# Altium schematic symbol library AliPadash.SchLib: 1186 symbols (part 6 of 6)
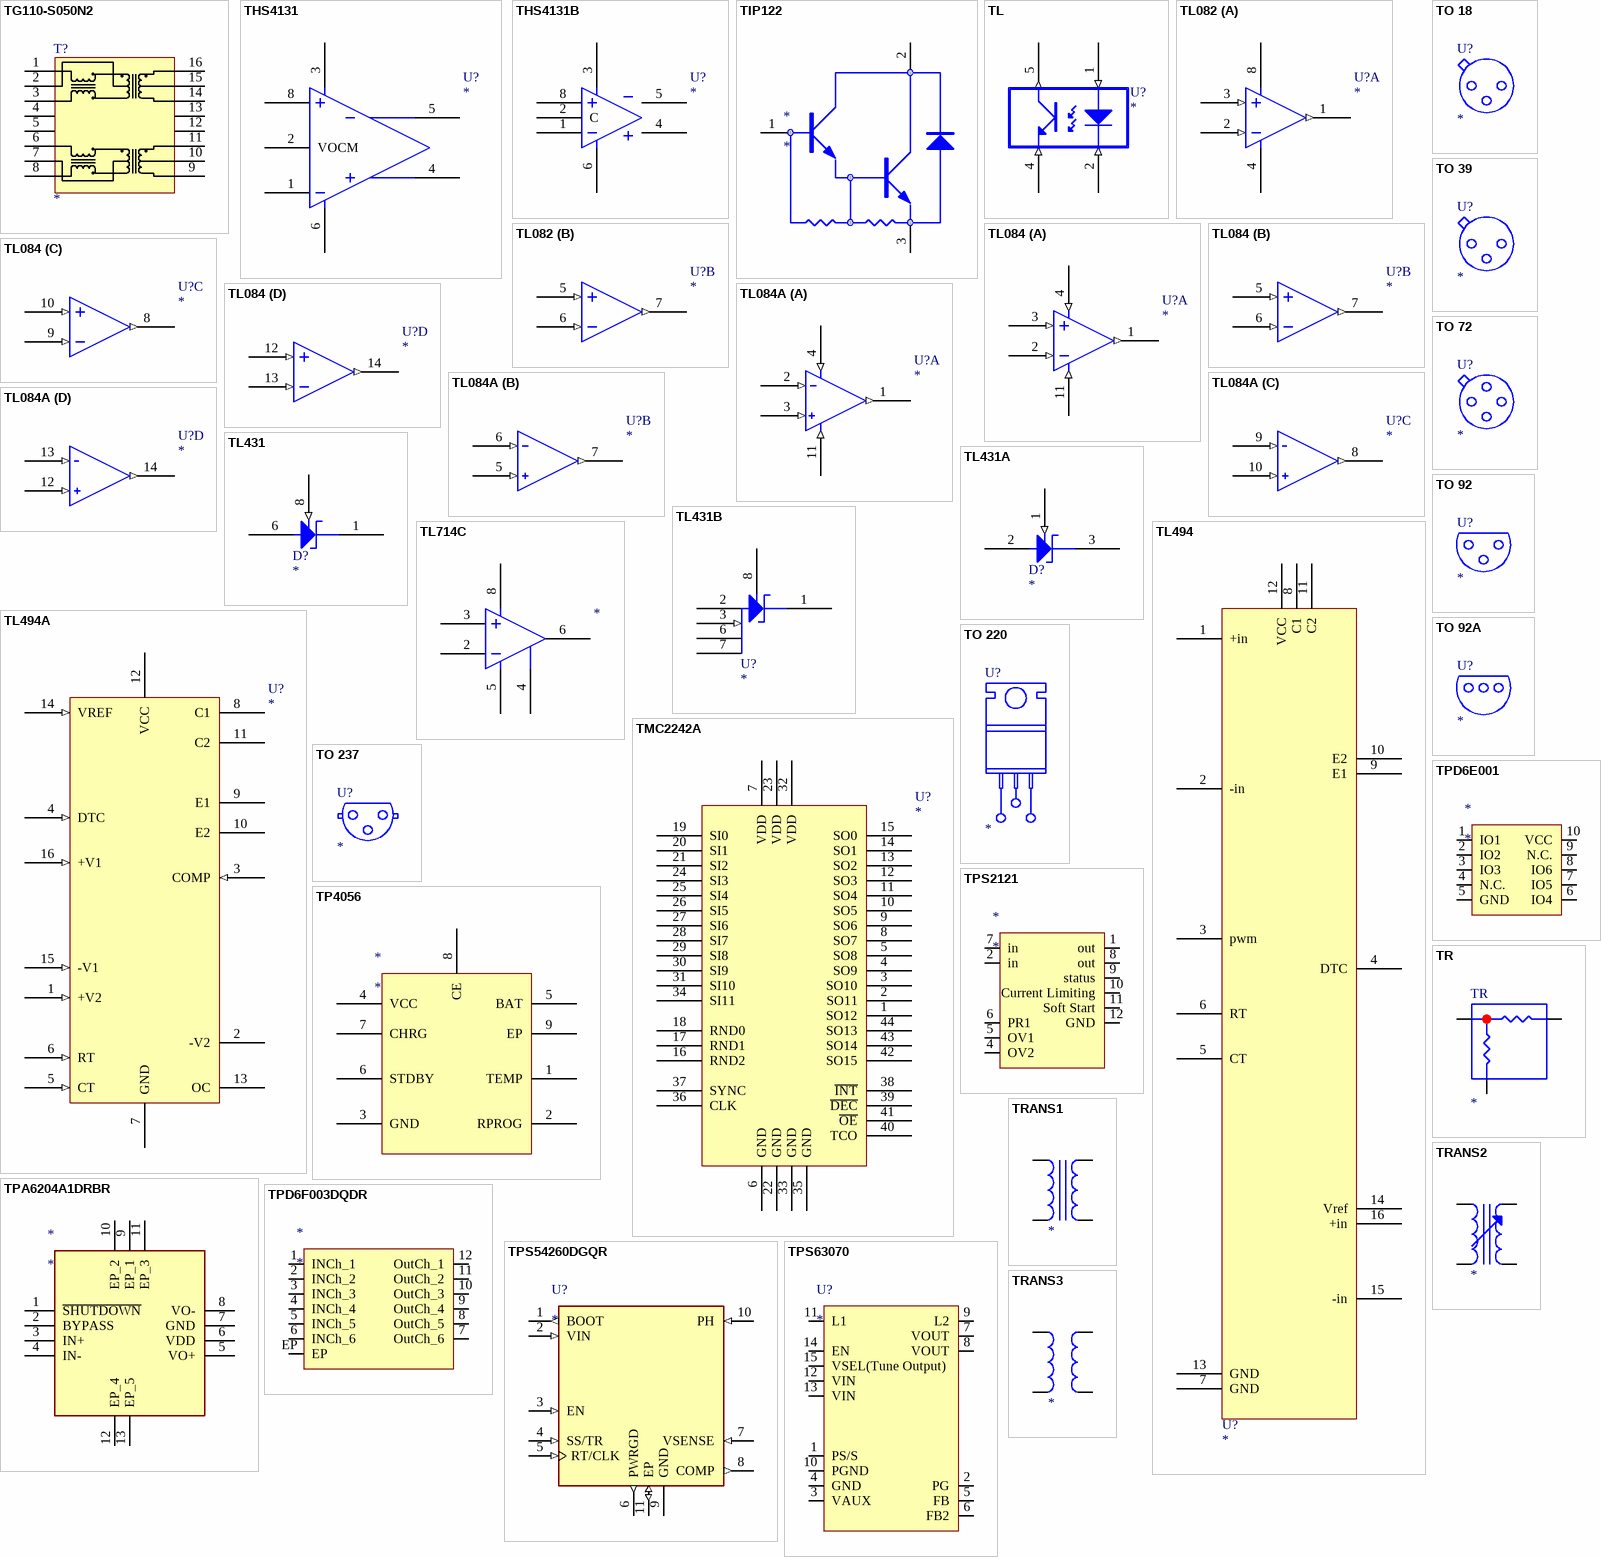
[diagram p91: symbols TG110-S050N2 to TRANS3]

## THS4131
designator U?
footprint SO-8
pins: 1, 2 VOCM, 3, 4, 5, 6, 8

## THS4131B
designator U?
footprint SO-8
pins: 1, 2 C, 3, 4, 5, 6, 8

## TIP122
designator *
pins: 1, 2, 3

## TL
designator U?
pins: 1 A (in), 2 C (in), 4 E (in), 5 CL (out)

## TL082
designator U?
part A pins: 1 OUT (out), 2 -IN (in), 3 +IN (in), 4 V-, 8 V+
part B pins: 5 +IN (in), 6 -IN (in), 7 OUT (out)

## TL084
designator U?
part A pins: 1 OUT (out), 2 IN- (in), 3 IN+ (in), 4 V+ (in), 11 V- (in)
part B pins: 5 IN+ (in), 6 IN- (in), 7 OUT (out)
part C pins: 8 OUT (out), 9 IN- (in), 10 IN+ (in)
part D pins: 12 IN+ (in), 13 IN- (in), 14 OUT (out)

## TL084A
designator U?
part A pins: 1 OUT (out), 2 IN- (in), 3 IN+ (in), 4 V+ (in), 11 V- (in)
part B pins: 5 IN+ (in), 6 IN- (in), 7 OUT (out)
part C pins: 8 OUT (out), 9 IN- (in), 10 IN+ (in)
part D pins: 12 IN+ (in), 13 IN- (in), 14 OUT (out)

## TL431
designator D?
pins: 1 C, 6 A, 8 VREF (in)

## TL431A
designator D?
footprint to-92
pins: 1 VREF (in), 2 A, 3 C

## TL431B
designator U?
footprint SO-8
pins: 1 C, 2 A, 3 VREF (in), 6, 7, 8

## TL494
designator U?
footprint DIP16
pins: 1 +in, 2 -in, 3 pwm, 4 DTC, 5 CT, 6 RT, 7 GND, 8 C1, 9 E1, 10 E2, 11 C2, 12 VCC, 13 GND, 14 Vref, 15 -in, 16 +in

## TL494A
designator U?
pins: 1 +V2 (in), 2 -V2, 3 COMP (in), 4 DTC (in), 5 CT (in), 6 RT (in), 7 GND, 8 C1, 9 E1, 10 E2, 11 C2, 12 VCC, 13 OC, 14 VREF (in), 15 -V1 (in), 16 +V1 (in)

## TL714C
designator ?
pins: 2, 3, 4, 5, 6, 8

## TMC2242A
designator U?
footprint LQFP44
pins: 1 SO12, 2 SO11, 3 SO10, 4 SO9, 5 SO8, 6 GND, 7 VDD, 8 SO7, 9 SO6, 10 SO5, 11 SO4, 12 SO3, 13 SO2, 14 SO1, 15 SO0, 16 RND2, 17 RND1, 18 RND0, 19 SI0, 20 SI1, 21 SI2, 22 GND, 23 VDD, 24 SI3, 25 SI4, 26 SI5, 27 SI6, 28 SI7, 29 SI8, 30 SI9, 31 SI10, 32 VDD, 33 GND, 34 SI11, 35 GND, 36 CLK, 37 SYNC, 38 ~{INT}, 39 ~{DEC}, 40 TCO, 41 ~{OE}, 42 SO15, 43 SO14, 44 SO13

## TO 18
designator U?

## TO 39
designator U?

## TO 72
designator U?

## TO 92
designator U?

## TO 92A
designator U?

## TO 220
designator U?

## TO 237
designator U?

## TP4056
designator *
footprint so-8-ep
pins: 1 TEMP, 2 RPROG, 3 GND, 4 VCC, 5 BAT, 6 STDBY, 7 CHRG, 8 CE, 9 EP

## TPA6204A1DRBR
designator *
MFAC: TPA6204A1DRBR; jlc: C12400
footprint TPA6204A1DRBR
pins: 1 ~{SHUTDOWN}, 2 BYPASS, 3 IN+, 4 IN-, 5 VO+, 6 VDD, 7 GND, 8 VO-, 9 EP_1, 10 EP_2, 11 EP_3, 12 EP_4, 13 EP_5

## TPD6E001
designator *
footprint UQFN10 (Footprint not found)
pins: 1 IO1, 2 IO2, 3 IO3, 4 N.C., 5 GND, 6 IO4, 7 IO5, 8 IO6, 9 N.C., 10 VCC

## TPD6F003DQDR
designator *
footprint DSV12 (Footprint not found)
pins: 1 INCh_1, 2 INCh_2, 3 INCh_3, 4 INCh_4, 5 INCh_5, 6 INCh_6, 7 OutCh_6, 8 OutCh_5, 9 OutCh_4, 10 OutCh_3, 11 OutCh_2, 12 OutCh_1, EP

## TPS2121
designator *
pins: 1 out, 2 in, 4 OV2, 5 OV1, 6 PR1, 7 in, 8 out, 9 status, 10 Current Limiting, 11 Soft Start, 12 GND

## TPS54260DGQR
designator U?
MFAC: TPS54260DGQR; JLC: C51800
footprint S_XTR111AIDGQR
pins: 1 BOOT (out), 2 VIN (in), 3 EN (in), 4 SS/TR (in), 5 RT/CLK (in), 6 PWRGD (out), 7 VSENSE (in), 8 COMP (out), 9 GND (power), 10 PH (in), 11 EP (io)

## TPS63070
designator U?
footprint VQFN15 (Footprint not found)
pins: 1 PS/S, 2 PG, 3 VAUX, 4 GND, 5 FB, 6 FB2, 7 VOUT, 8 VOUT, 9 L2, 10 PGND, 11 L1, 12 VIN, 13 VIN, 14 EN, 15 VSEL(Tune Output)

## TR
designator TR
pins: 1, 2, 3

## TRANS1
designator ?
pins: 1, 2, 3, 4

## TRANS2
designator ?
pins: 1, 2, 3, 4

## TRANS3
designator ?
pins: 1, 2, 3, 4

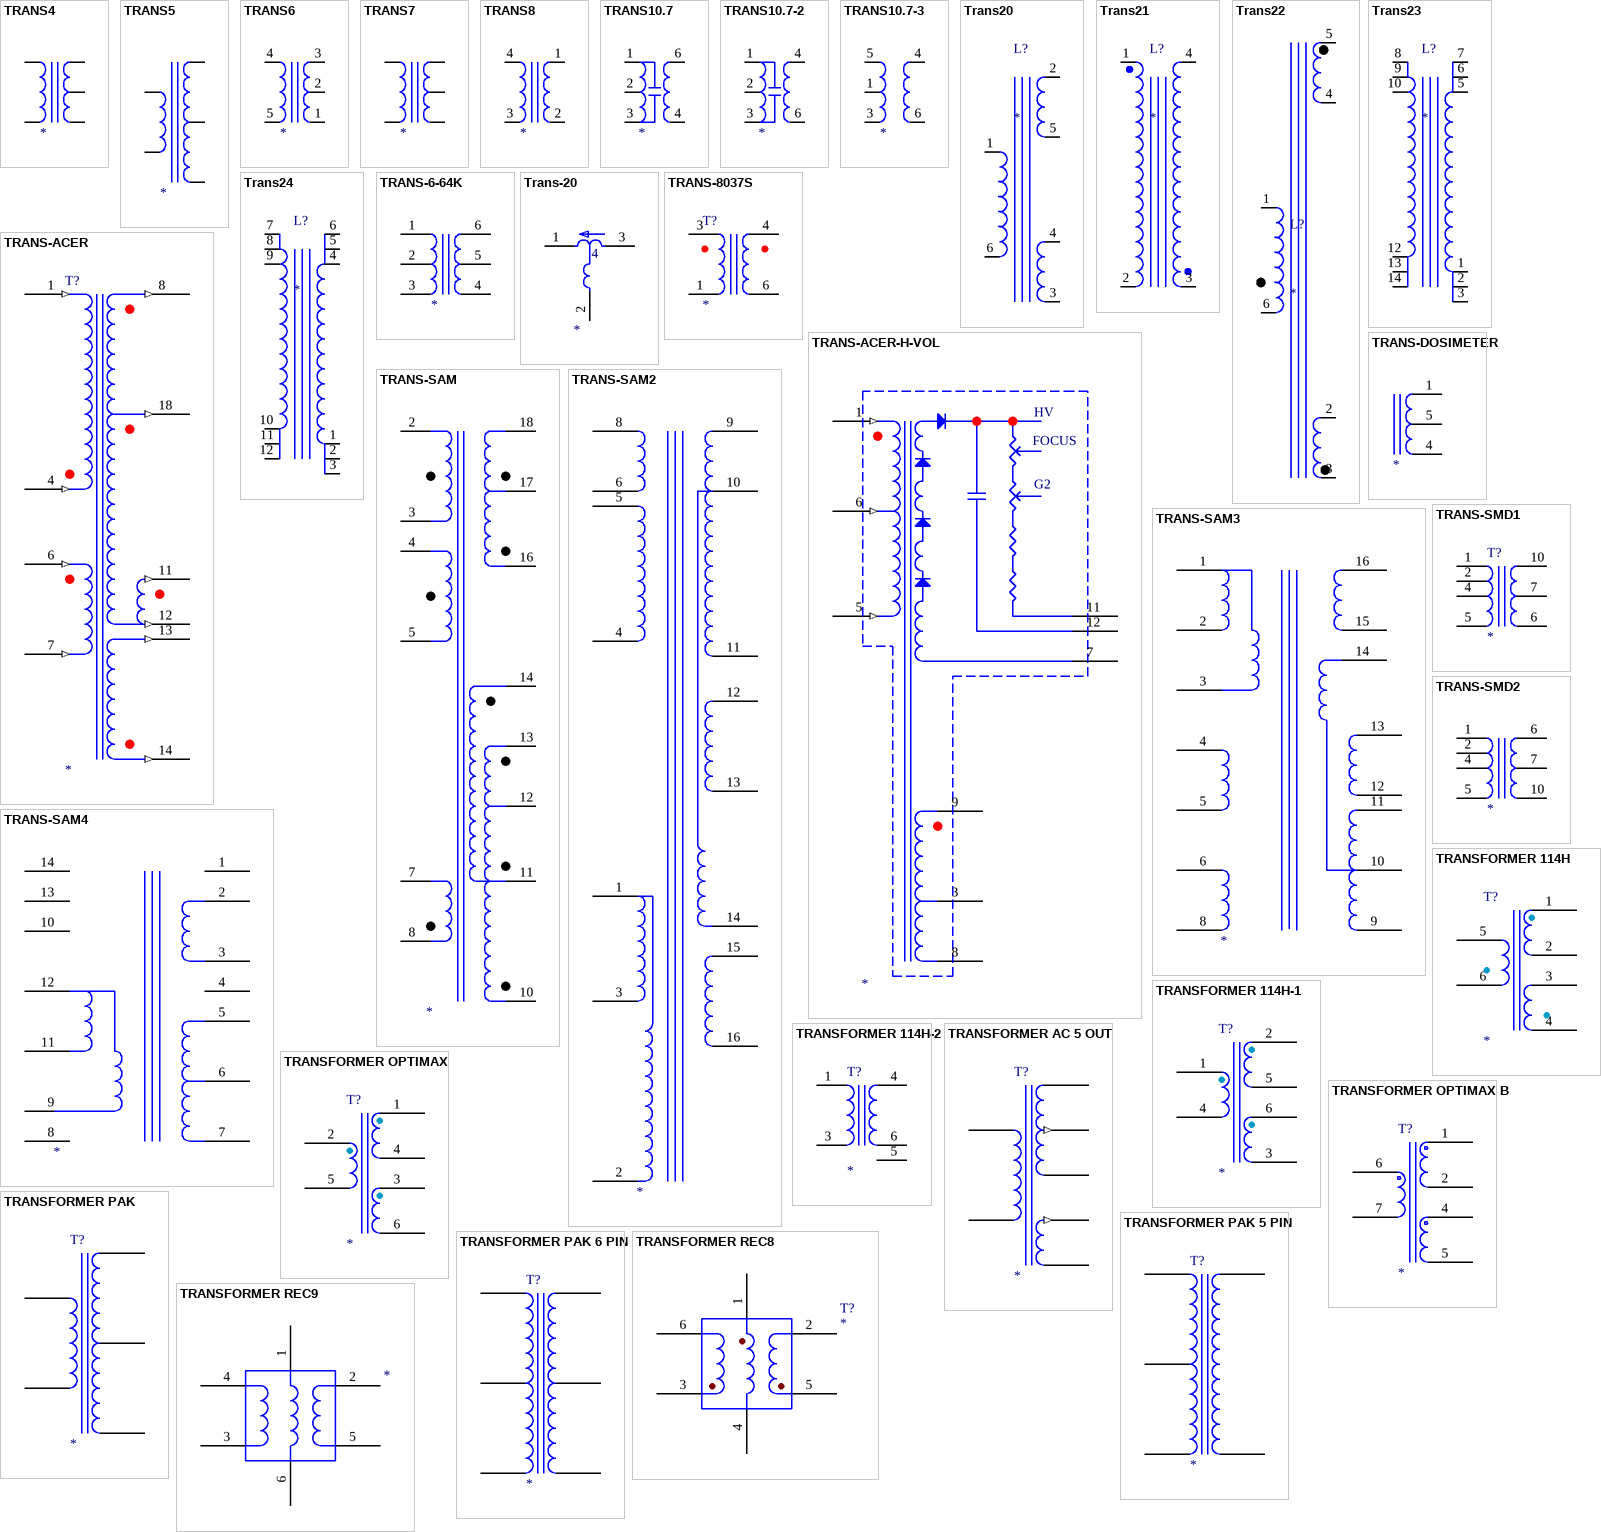
[diagram p76: symbols TRANS4 to TRANSFORMER REC9]

## TRANS4
designator ?
pins: 1, 2, 3, 4, 5

## TRANS5
designator ?
pins: 1, 2, 3, 4, 5

## TRANS6
designator ?
pins: 1, 2, 3, 4, 5

## TRANS7
designator ?
pins: 1, 2, 3, 4, 6

## TRANS8
designator ?
pins: 1, 2, 3, 4

## TRANS10.7
designator ?
pins: 1, 2, 3, 4, 6

## TRANS10.7-2
designator ?
pins: 1, 2, 3, 4, 6

## TRANS10.7-3
designator ?
pins: 1, 3, 4, 5, 6

## Trans20
designator L?
pins: 1, 2, 3, 4, 5, 6

## Trans21
designator L?
pins: 1, 2, 3, 4

## Trans22
designator L?
pins: 1, 2, 3, 4, 5, 6

## Trans23
designator L?
pins: 1, 2, 3, 5, 6, 7, 8, 9, 10, 12, 13, 14

## Trans24
designator L?
pins: 1, 2, 3, 4, 5, 6, 7, 8, 9, 10, 11, 12

## TRANS-6-64K
designator ?
pins: 1, 2, 3, 4, 5, 6

## Trans-20
designator ?
pins: 1, 2, 3
text: 4

## TRANS-8037S
designator T?
footprint TRANS-8037S
pins: 1, 3, 4, 6

## TRANS-ACER
designator T?
pins: 1 (in), 4 (in), 6 (in), 7 (in), 8 (out), 11 (out), 12 (out), 13 (out), 14 (out), 18 (out)

## TRANS-ACER-H-VOL
designator ?
pins: 1 (in), 3, 5 (in), 6 (in), 7, 8, 9, 11, 12
text: HV; FOCUS; G2

## TRANS-DOSIMETER
designator ?
pins: 1, 4, 5

## TRANS-SAM
designator ?
pins: 2, 3, 4, 5, 7, 8, 10, 11, 12, 13, 14, 16, 17, 18

## TRANS-SAM2
designator ?
pins: 1, 2, 3, 4, 5, 6, 8, 9, 10, 11, 12, 13, 14, 15, 16

## TRANS-SAM3
designator ?
pins: 1, 2, 3, 4, 5, 6, 8, 9, 10, 11, 12, 13, 14, 15, 16

## TRANS-SAM4
designator ?
pins: 1, 2, 3, 4, 5, 6, 7, 8, 9, 10, 11, 12, 13, 14

## TRANS-SMD1
designator T?
pins: 1, 2, 4, 5, 6, 7, 10

## TRANS-SMD2
designator ?
pins: 1, 2, 4, 5, 6, 7, 10

## TRANSFORMER 114H
designator T?
pins: 1 A1, 2 A2, 3 C1, 4 C2, 5 B1, 6 B2

## TRANSFORMER 114H-1
designator T?
pins: 1 B1, 2 A1, 3 C2, 4 B2, 5 A2, 6 C1

## TRANSFORMER 114H-2
designator T?
footprint 114H1-TDK-2
pins: 1 B1, 3 B2, 4 A1, 5 C2, 6 A2

## TRANSFORMER AC 5 OUT
designator T?
pins: IN1, IN2, OUT1, OUT2 (out), OUT3, OUT4 (out), OUT5

## TRANSFORMER OPTIMAX
designator T?
pins: 1 A1, 2 B1, 3 C1, 4 A2, 5 B2, 6 C2

## TRANSFORMER OPTIMAX B
designator T?
pins: 1, 2, 4 14, 5, 6, 7

## TRANSFORMER PAK
designator T?
pins: A1, A2, B1, B2, B3

## TRANSFORMER PAK 5 PIN
designator T?
pins: A, B, C, D, E

## TRANSFORMER PAK 6 PIN
designator T?
pins: A, B, C, D, E, F

## TRANSFORMER REC8
designator T?
pins: 1 A, 2 B, 3 C, 4 D, 5 E, 6 F

## TRANSFORMER REC9
designator ?
pins: 1 A, 2 B, 3 C, 4 D, 5 E, 6 F

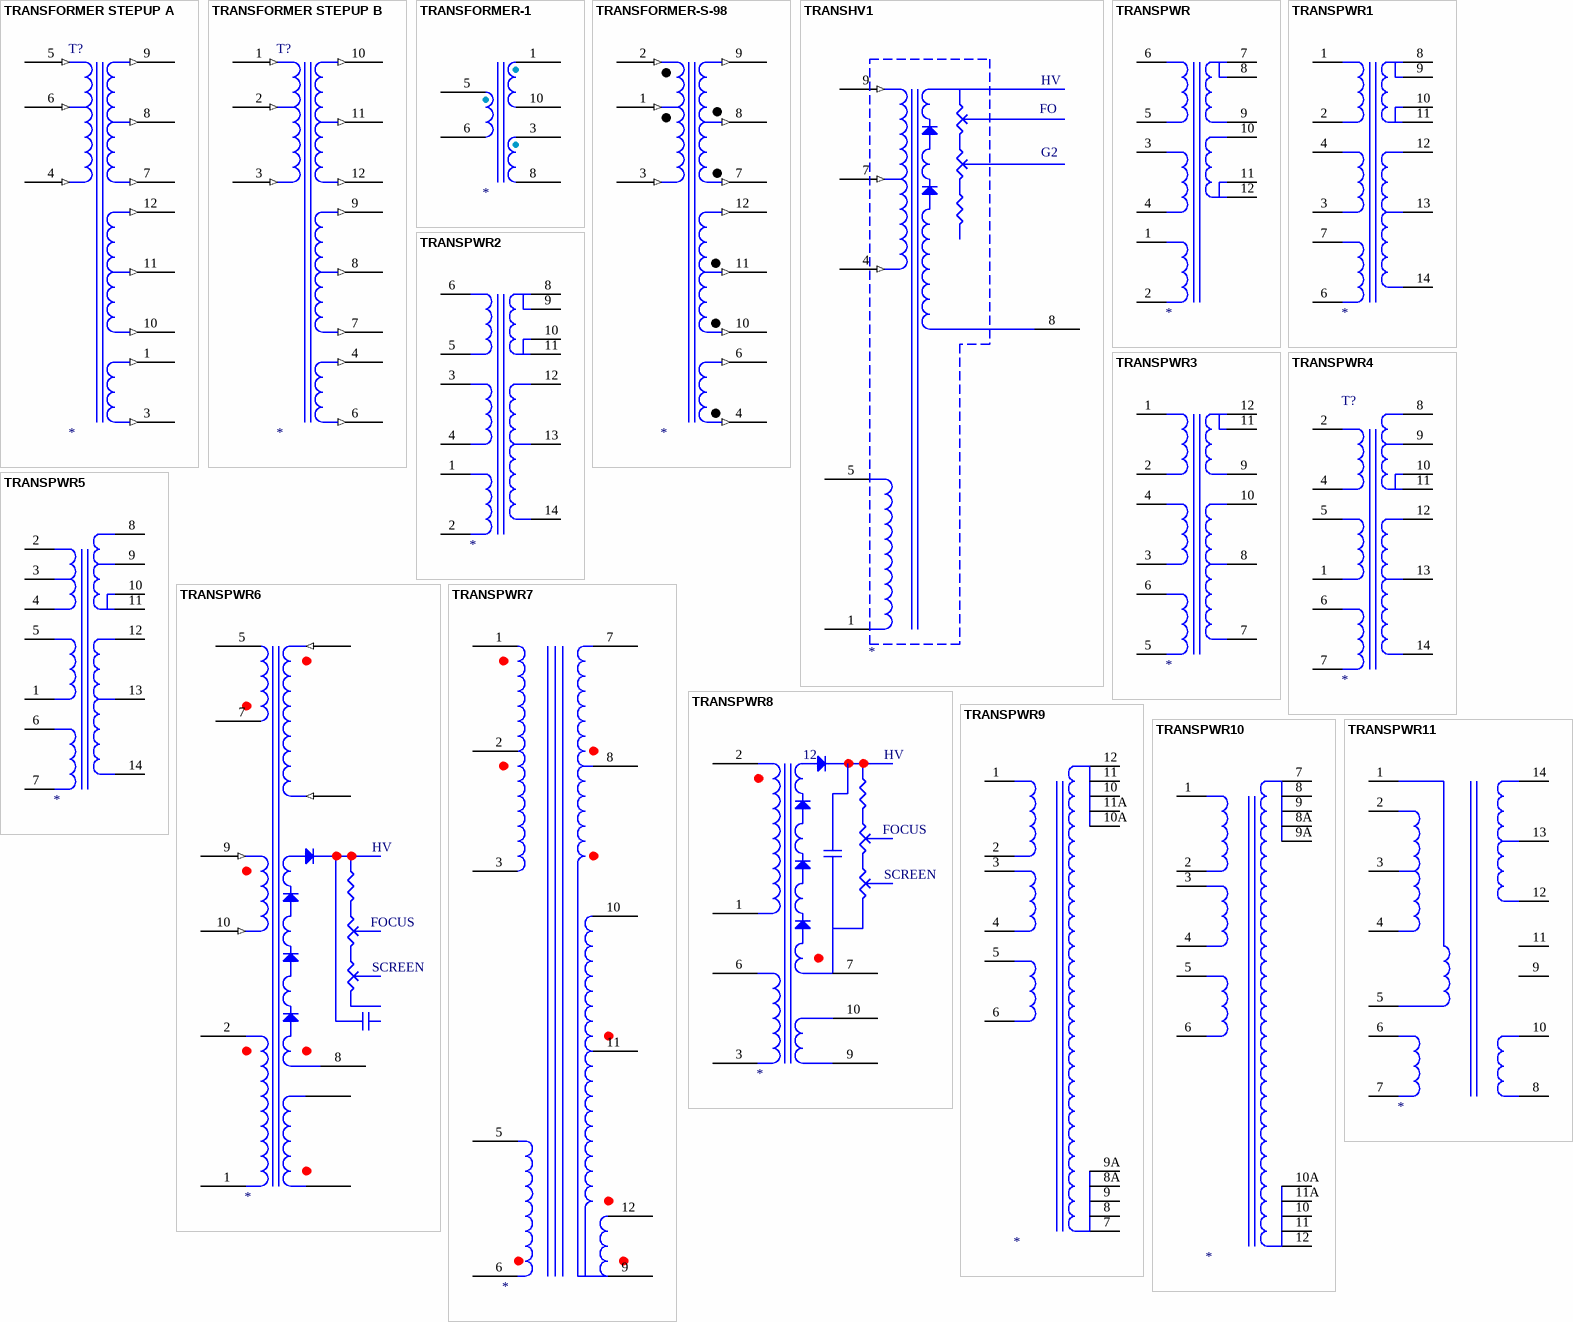
[diagram p77: symbols TRANSFORMER STEPUP A to TRANSPWR11]

## TRANSFORMER STEPUP A
designator T?
pins: 1 OUT7 (out), 3 OUT8 (out), 4 IN3 (in), 5 OUT9 (in), 6 IN2 (in), 7 OUT3 (out), 8 OUT2 (out), 9 OUT1 (out), 10 OUT6 (out), 11 OUT5 (out), 12 OUT4 (out)

## TRANSFORMER STEPUP B
designator T?
pins: 1 OUT9 (in), 2 IN2 (in), 3 IN3 (in), 4 OUT7 (out), 6 OUT8 (out), 7 OUT6 (out), 8 OUT5 (out), 9 OUT4 (out), 10 OUT1 (out), 11 OUT2 (out), 12 OUT3 (out)

## TRANSFORMER-1
designator ?
pins: 1, 3 C1, 5 B1, 6 B2, 8 C2, 10 A2

## TRANSFORMER-S-98
designator ?
pins: 1 IN2 (in), 2 OUT9 (in), 3 IN3 (in), 4 OUT8 (out), 6 OUT7 (out), 7 OUT3 (out), 8 OUT2 (out), 9 OUT1 (out), 10 OUT6 (out), 11 OUT5 (out), 12 OUT4 (out)

## TRANSHV1
designator ?
pins: 1, 4 (in), 5, 7 (in), 8, 9 (in)
text: HV; FO; G2

## TRANSPWR
designator ?
pins: 1, 2, 3, 4, 5, 6, 7, 8, 9, 10, 11, 12

## TRANSPWR1
designator ?
pins: 1, 2, 3, 4, 6, 7, 8, 9, 10, 11, 12, 13, 14

## TRANSPWR2
designator ?
pins: 1, 2, 3, 4, 5, 6, 8, 9, 10, 11, 12, 13, 14

## TRANSPWR3
designator ?
pins: 1, 2, 3, 4, 5, 6, 7, 8, 9, 10, 11, 12

## TRANSPWR4
designator T?
T?
pins: 1, 2, 4, 5, 6, 7, 8, 9, 10, 11, 12, 13, 14

## TRANSPWR5
designator ?
pins: 1, 2, 3 0, 4, 5, 6, 7, 8, 9, 10, 11, 12, 13, 14

## TRANSPWR6
designator ?
pins: 1, 2, 5, 7, 8, 9 (in), 10 (in), ?1, ?2, ?3 (in), ?4 (in)
text: HV; FOCUS; SCREEN

## TRANSPWR7
designator ?
pins: 1, 2, 3, 5, 6, 7, 8, 9, 10, 11, 12

## TRANSPWR8
designator ?
pins: 1, 2, 3, 6, 7, 9, 10
text: 12; HV; FOCUS; SCREEN

## TRANSPWR9
designator ?
pins: 1, 2, 3 0, 4, 5, 6, 7, 8, 8A, 9, 9A, 10, 10A, 11, 11A, 12

## TRANSPWR10
designator ?
pins: 1, 2, 3 0, 4, 5, 6, 7, 8, 8A, 9, 9A, 10, 10A, 11, 11A, 12

## TRANSPWR11
designator ?
pins: 1, 2, 3 0, 4, 5, 6, 7, 8, 9, 10, 11, 12, 13, 14

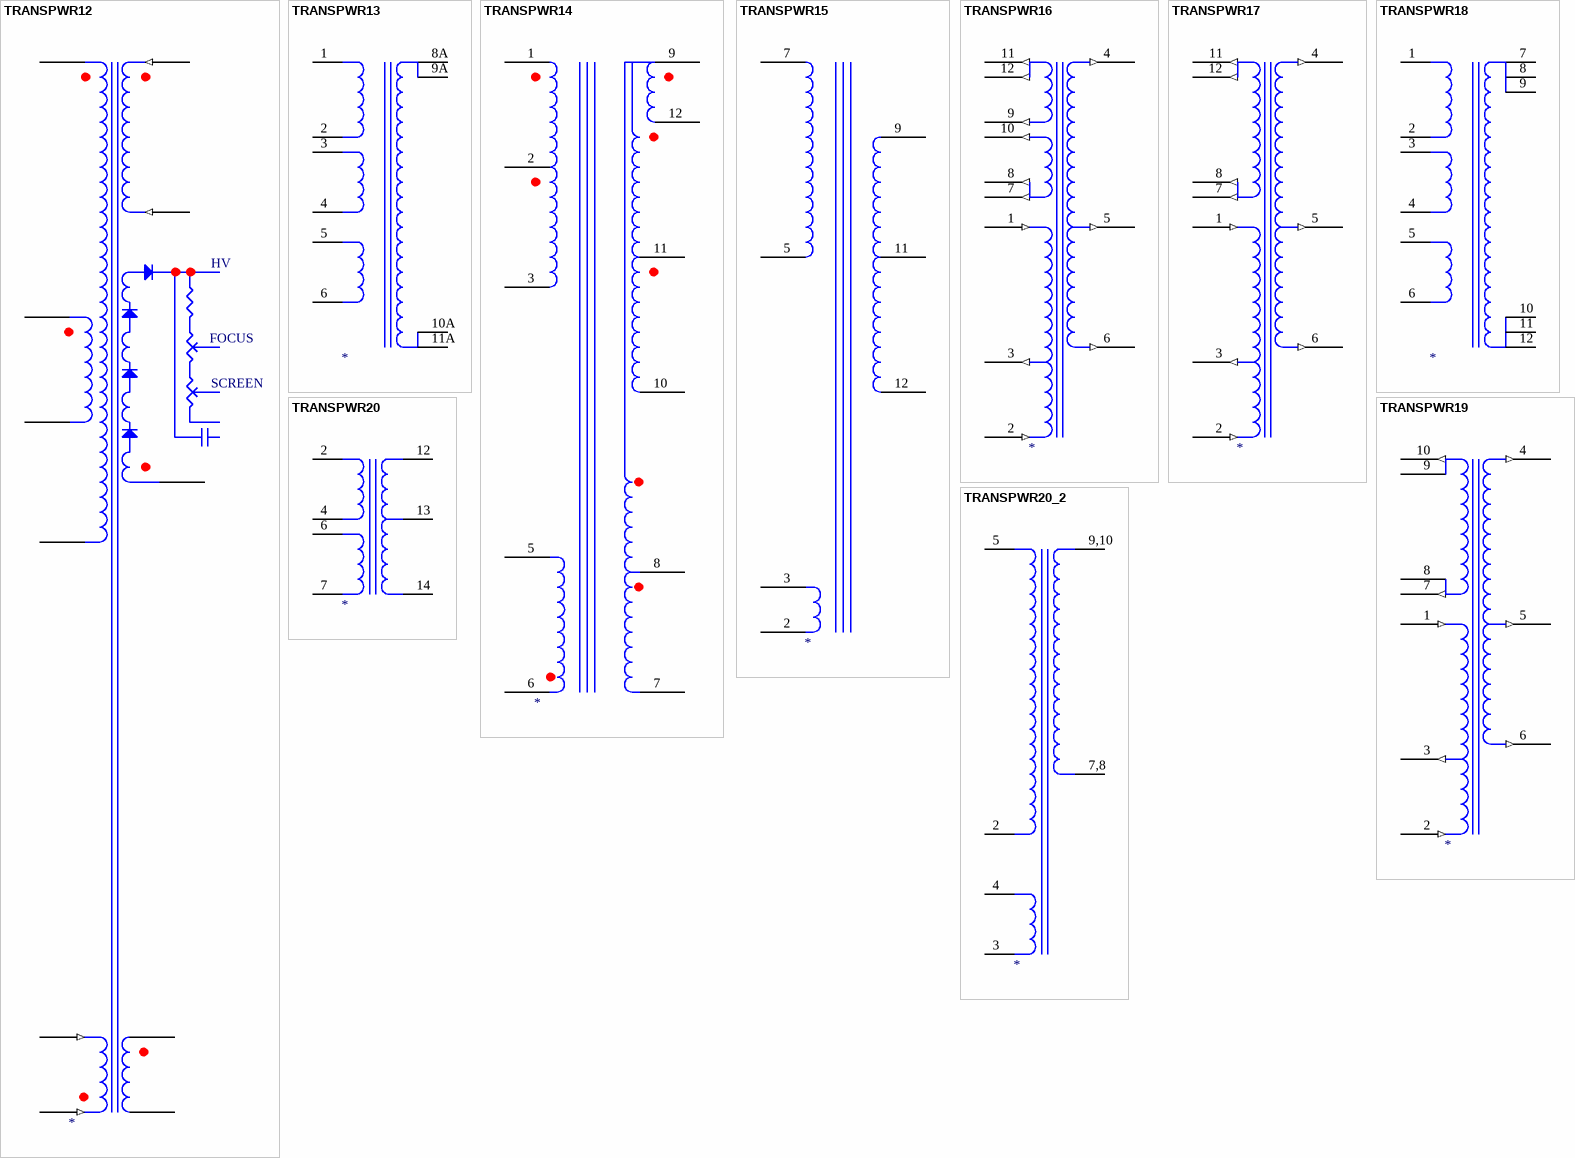
[diagram p78: symbols TRANSPWR12 to TRANSPWR20_2]

## TRANSPWR12
designator ?
pins: ?1 (in), ?2 (in), ?3, ?4, ?5, ?6, ?7, ?8 (in), ?9 (in), ?10, ?11
text: HV; FOCUS; SCREEN

## TRANSPWR13
designator ?
pins: 1, 2, 3 0, 4, 5, 6, 8A, 9A, 10A, 11A

## TRANSPWR14
designator ?
pins: 1, 2, 3, 5, 6, 7, 8, 9, 10, 11, 12

## TRANSPWR15
designator ?
pins: 2, 3, 5, 7, 9, 11, 12

## TRANSPWR16
designator ?
pins: 1 OUT9 (in), 2 IN3 (in), 3 OUT7 (out), 4 OUT2 (out), 5 OUT1 (out), 6 OUT3 (out), 7 OUT4 (out), 8 OUT4 (out), 9 OUT4 (out), 10 OUT4 (out), 11 OUT5 (out), 12 OUT4 (out)

## TRANSPWR17
designator ?
pins: 1 OUT9 (in), 2 IN3 (in), 3 OUT7 (out), 4 OUT2 (out), 5 OUT1 (out), 6 OUT3 (out), 7 OUT4 (out), 8 OUT4 (out), 11 OUT5 (out), 12 OUT4 (out)

## TRANSPWR18
designator ?
pins: 1, 2, 3 0, 4, 5, 6, 7, 8, 9, 10, 11, 12

## TRANSPWR19
designator ?
pins: 1 OUT9 (in), 2 IN3 (in), 3 OUT7 (out), 4 OUT2 (out), 5 OUT1 (out), 6 OUT3 (out), 7 OUT4 (out), 8, 9, 10 (out)

## TRANSPWR20
designator ?
pins: 2, 4, 6, 7, 12, 13, 14

## TRANSPWR20_2
designator ?
pins: 2, 3, 4, 5, 7,8, 9,10

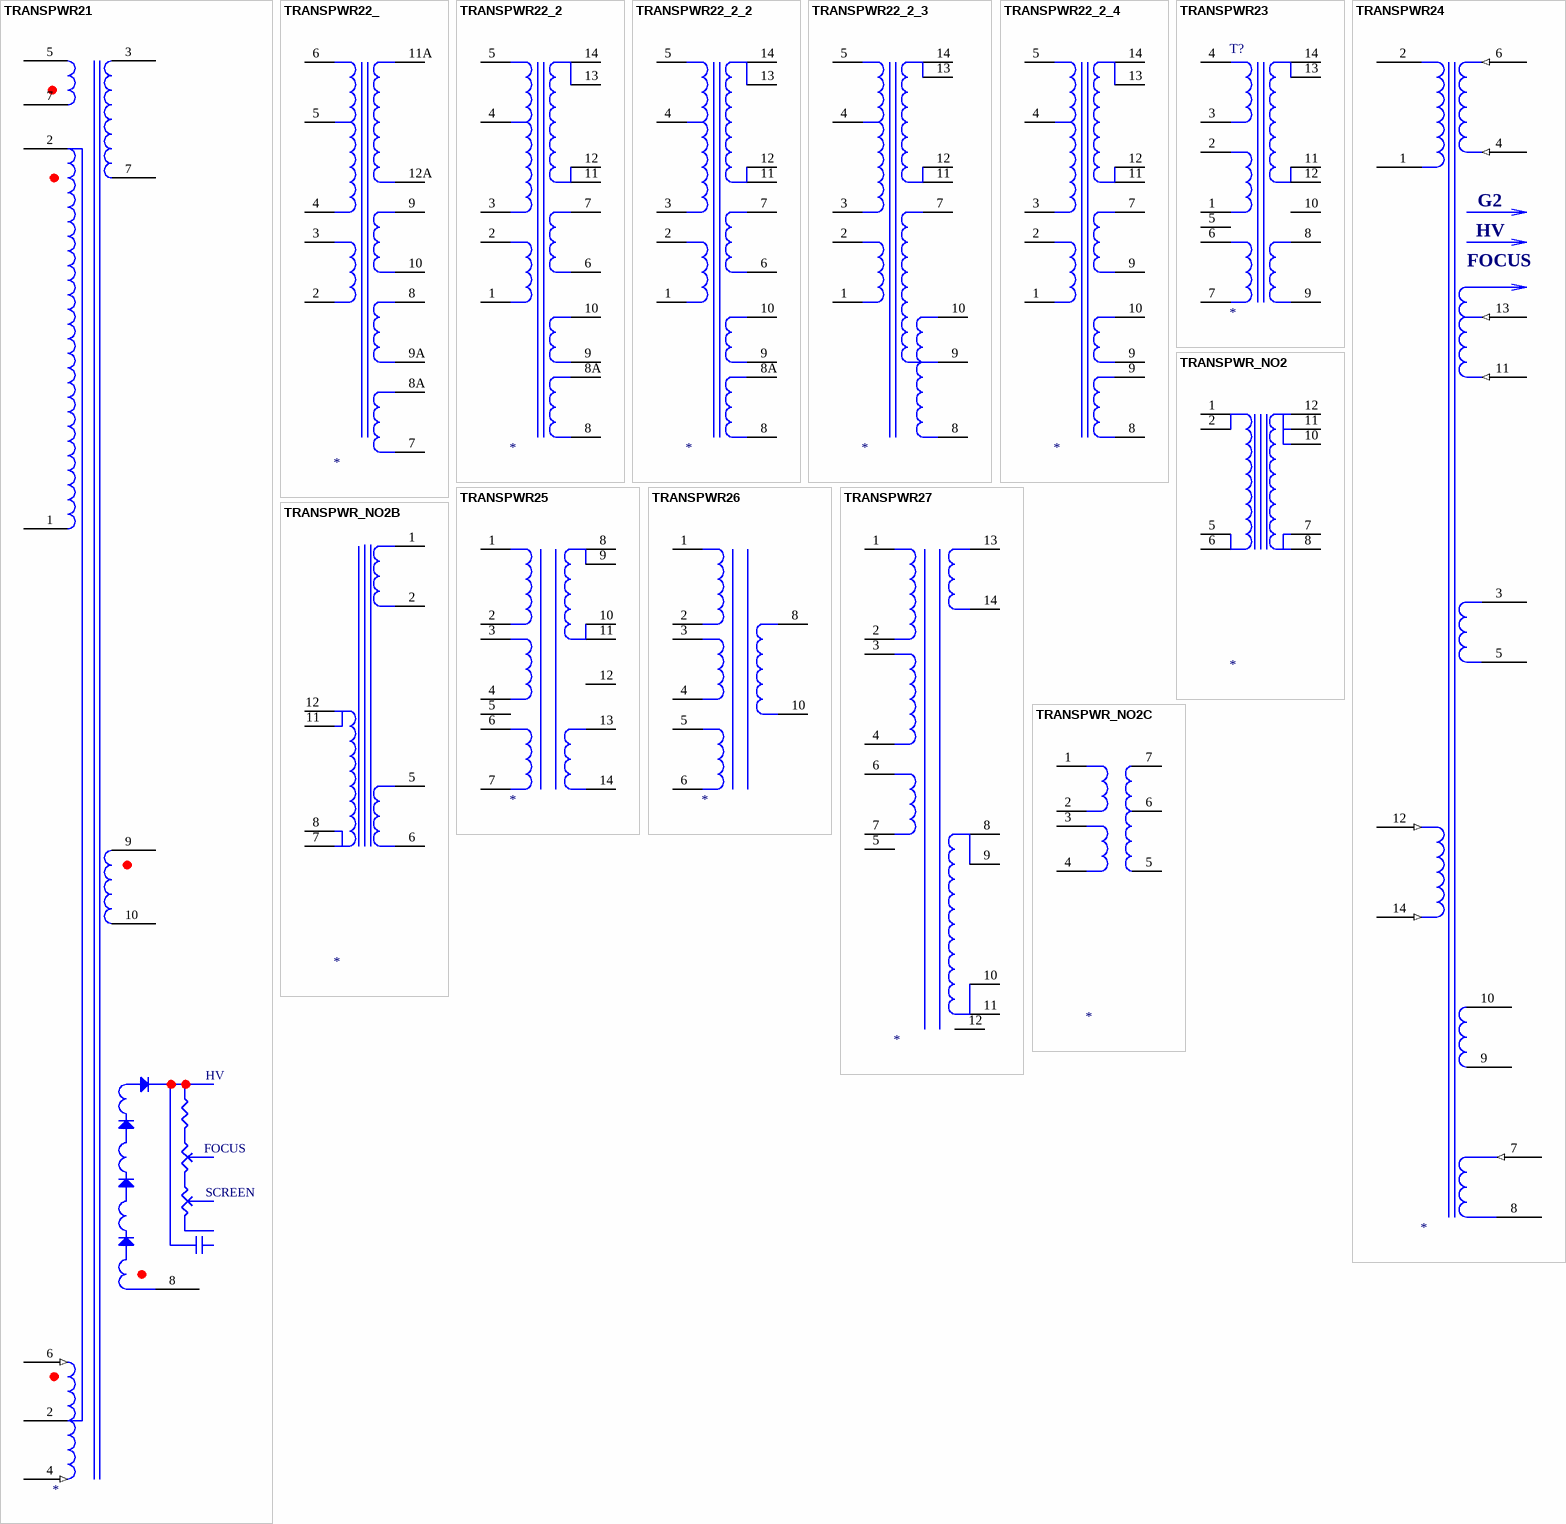
[diagram p79: symbols TRANSPWR21 to TRANSPWR_NO2C]

## TRANSPWR21
designator ?
pins: 1, 2, 2, 3, 4 (in), 5, 6 (in), 7, 7, 8, 9, 10
text: HV; FOCUS; SCREEN

## TRANSPWR22_
designator ?
pins: 2, 3, 4, 5 0, 6, 7, 8, 8A, 9, 9A, 10, 11A, 12A

## TRANSPWR22_2
designator ?
pins: 1, 2, 3, 4 0, 5, 6, 7, 8, 8A, 9, 10, 11, 12, 13, 14

## TRANSPWR22_2_2
designator ?
pins: 1, 2, 3, 4 0, 5, 6, 7, 8, 8A, 9, 10, 11, 12, 13, 14

## TRANSPWR22_2_3
designator ?
pins: 1, 2, 3, 4 0, 5, 7, 8, 9, 10, 11, 12, 13, 14

## TRANSPWR22_2_4
designator ?
pins: 1, 2, 3, 4 0, 5, 7, 8, 9, 9, 9, 10, 11, 12, 13, 14

## TRANSPWR23
designator T?
footprint TRANSPWR2
pins: 1, 2, 3 0, 4, 5, 6, 7, 8, 9, 10, 11, 12, 13, 14

## TRANSPWR24
designator ?
pins: 1, 2, 3, 4 (in), 5, 6 (in), 7 (in), 8, 9, 10, 11 (in), 12 (in), 13 (in), 14 (in)
text: G2; HV; FOCUS

## TRANSPWR25
designator ?
pins: 1, 2, 3 0, 4, 5, 6, 7, 8, 9, 10, 11, 12, 13, 14

## TRANSPWR26
designator ?
pins: 1, 2, 3 0, 4, 5, 6, 8, 10

## TRANSPWR27
designator ?
pins: 1, 2, 3 0, 4, 5, 6, 7, 8, 9, 10, 11, 12, 13, 14

## TRANSPWR_NO2
designator ?
pins: 1, 2, 5, 6, 7, 8, 10, 11, 12

## TRANSPWR_NO2B
designator ?
pins: 1, 2, 5, 6, 7, 8, 11, 12

## TRANSPWR_NO2C
designator ?
pins: 1, 2, 3, 4, 5, 6, 7

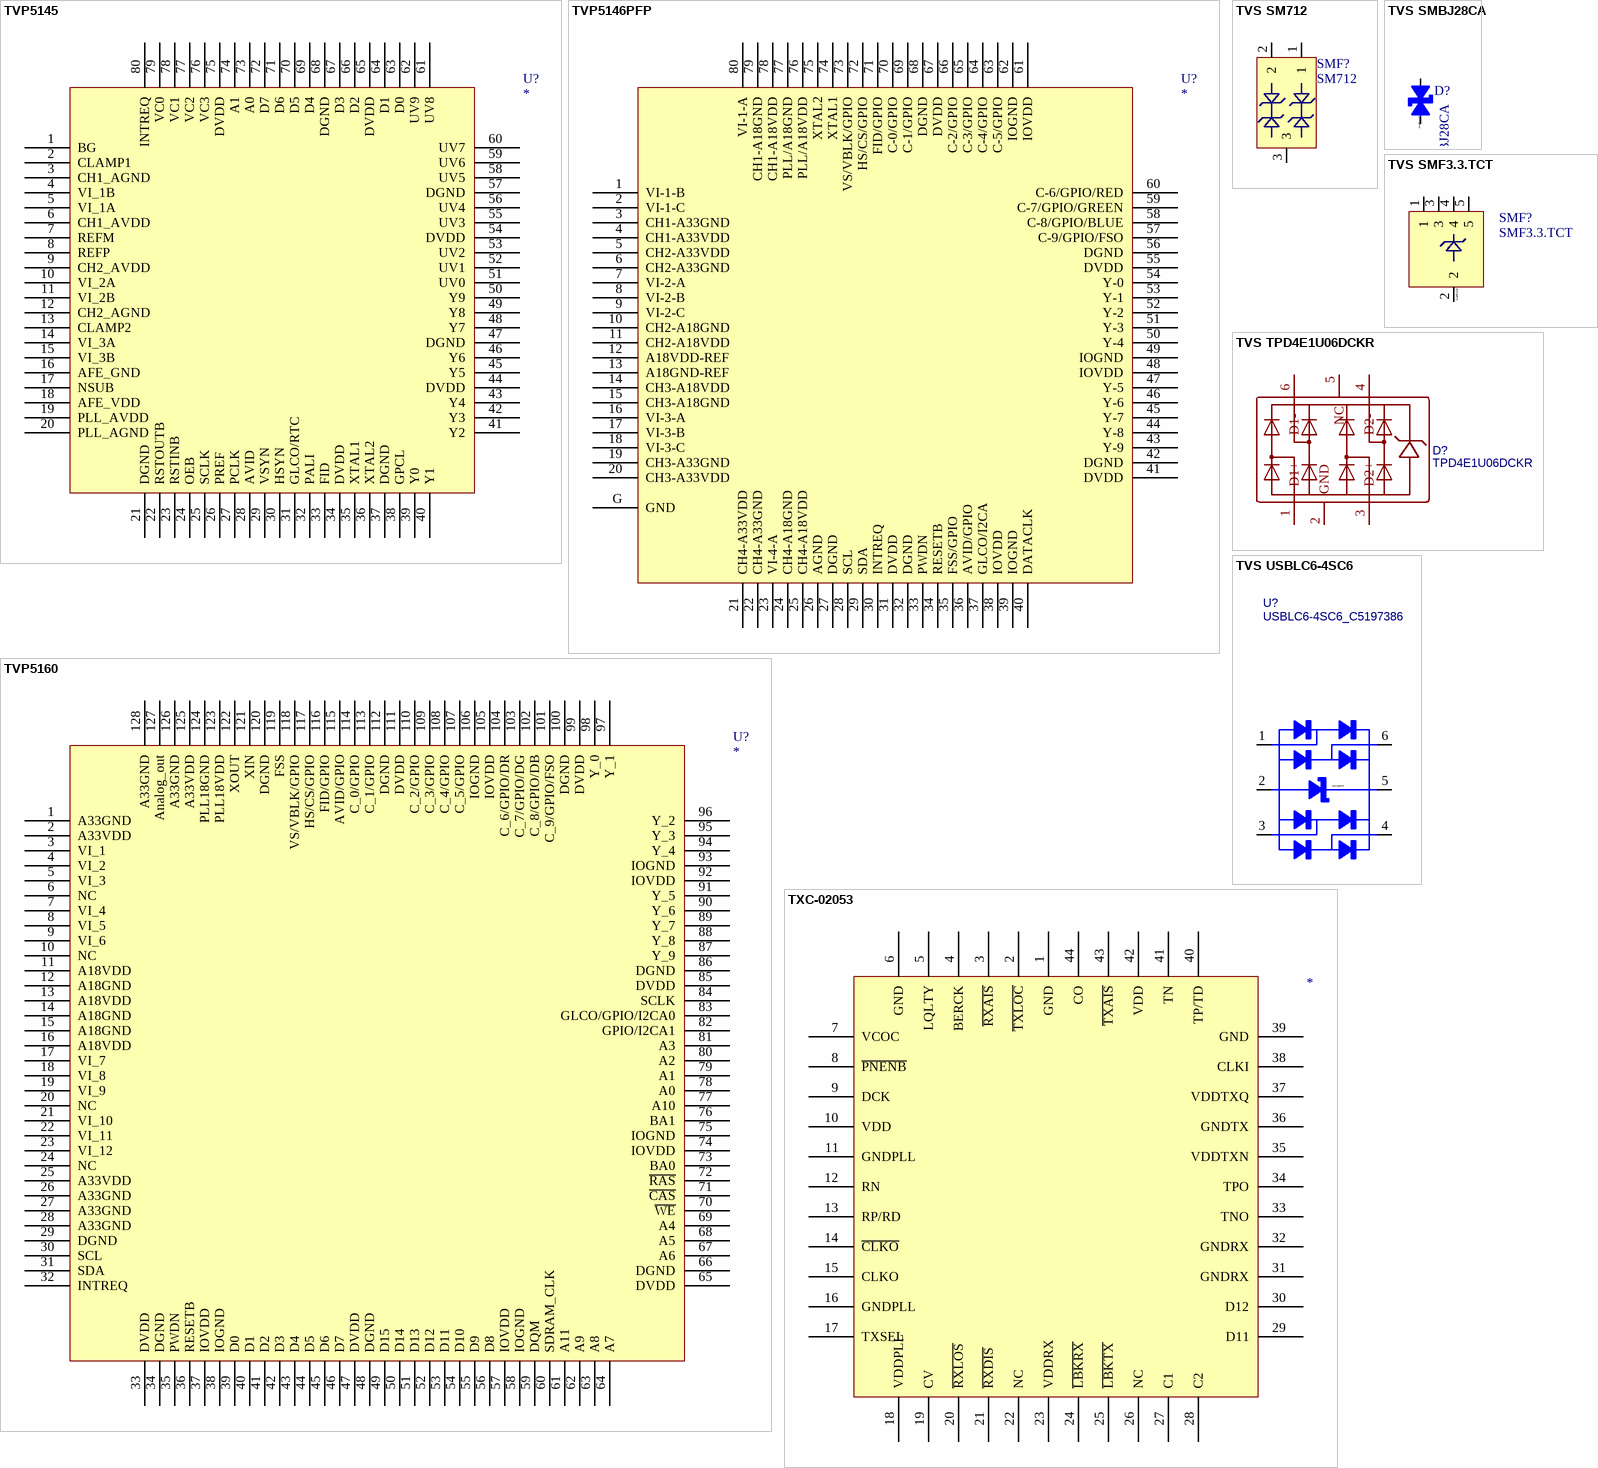
[diagram p80: symbols TVP5145 to TXC-02053]

## TVP5145
designator U?
footprint PQFP-G80
pins: 1 BG, 2 CLAMP1, 3 CH1_AGND, 4 VI_1B, 5 VI_1A, 6 CH1_AVDD, 7 REFM, 8 REFP, 9 CH2_AVDD, 10 VI_2A, 11 VI_2B, 12 CH2_AGND, 13 CLAMP2, 14 VI_3A, 15 VI_3B, 16 AFE_GND, 17 NSUB, 18 AFE_VDD, 19 PLL_AVDD, 20 PLL_AGND, 21 DGND, 22 RSTOUTB, 23 RSTINB, 24 OEB, 25 SCLK, 26 PREF, 27 PCLK, 28 AVID, 29 VSYN, 30 HSYN, 31 GLCO/RTC, 32 PALI, 33 FID, 34 DVDD, 35 XTAL1, 36 XTAL2, 37 DGND, 38 GPCL, 39 Y0, 40 Y1, 41 Y2, 42 Y3, 43 Y4, 44 DVDD, 45 Y5, 46 Y6, 47 DGND, 48 Y7, 49 Y8, 50 Y9, 51 UV0, 52 UV1, 53 UV2, 54 DVDD, 55 UV3, 56 UV4, 57 DGND, 58 UV5, 59 UV6, 60 UV7, 61 UV8, 62 UV9, 63 D0, 64 D1, 65 DVDD, 66 D2, 67 D3, 68 DGND, 69 D4, 70 D5, 71 D6, 72 D7, 73 A0, 74 A1, 75 DVDD, 76 VC3, 77 VC2, 78 VC1, 79 VC0, 80 INTREQ

## TVP5146PFP
designator U?
footprint PQFP-G80
pins: 1 VI-1-B, 2 VI-1-C, 3 CH1-A33GND, 4 CH1-A33VDD, 5 CH2-A33VDD, 6 CH2-A33GND, 7 VI-2-A, 8 VI-2-B, 9 VI-2-C, 10 CH2-A18GND, 11 CH2-A18VDD, 12 A18VDD-REF, 13 A18GND-REF, 14 CH3-A18VDD, 15 CH3-A18GND, 16 VI-3-A, 17 VI-3-B, 18 VI-3-C, 19 CH3-A33GND, 20 CH3-A33VDD, 21 CH4-A33VDD, 22 CH4-A33GND, 23 VI-4-A, 24 CH4-A18GND, 25 CH4-A18VDD, 26 AGND, 27 DGND, 28 SCL, 29 SDA, 30 INTREQ, 31 DVDD, 32 DGND, 33 PWDN, 34 RESETB, 35 FSS/GPIO, 36 AVID/GPIO, 37 GLCO/I2CA, 38 IOVDD, 39 IOGND, 40 DATACLK, 41 DVDD, 42 DGND, 43 Y-9, 44 Y-8, 45 Y-7, 46 Y-6, 47 Y-5, 48 IOVDD, 49 IOGND, 50 Y-4, 51 Y-3, 52 Y-2, 53 Y-1, 54 Y-0, 55 DVDD, 56 DGND, 57 C-9/GPIO/FSO, 58 C-8/GPIO/BLUE, 59 C-7/GPIO/GREEN, 60 C-6/GPIO/RED, 61 IOVDD, 62 IOGND, 63 C-5/GPIO, 64 C-4/GPIO, 65 C-3/GPIO, 66 C-2/GPIO, 67 DVDD, 68 DGND, 69 C-1/GPIO, 70 C-0/GPIO, 71 FID/GPIO, 72 HS/CS/GPIO, 73 VS/VBLK/GPIO, 74 XTAL1, 75 XTAL2, 76 PLL/A18VDD, 77 PLL/A18GND, 78 CH1-A18VDD, 79 CH1-A18GND, 80 VI-1-A, G GND

## TVP5160
designator U?
footprint S-PQFP-G128
pins: 1 A33GND, 2 A33VDD, 3 VI_1, 4 VI_2, 5 VI_3, 6 NC, 7 VI_4, 8 VI_5, 9 VI_6, 10 NC, 11 A18VDD, 12 A18GND, 13 A18VDD, 14 A18GND, 15 A18GND, 16 A18VDD, 17 VI_7, 18 VI_8, 19 VI_9, 20 NC, 21 VI_10, 22 VI_11, 23 VI_12, 24 NC, 25 A33VDD, 26 A33GND, 27 A33GND, 28 A33GND, 29 DGND, 30 SCL, 31 SDA, 32 INTREQ, 33 DVDD, 34 DGND, 35 PWDN, 36 RESETB, 37 IOVDD, 38 IOGND, 39 D0, 40 D1, 41 D2, 42 D3, 43 D4, 44 D5, 45 D6, 46 D7, 47 DVDD, 48 DGND, 49 D15, 50 D14, 51 D13, 52 D12, 53 D11, 54 D10, 55 D9, 56 D8, 57 IOVDD, 58 IOGND, 59 DQM, 60 SDRAM_CLK, 61 A11, 62 A9, 63 A8, 64 A7, 65 DVDD, 66 DGND, 67 A6, 68 A5, 69 A4, 70 ~{WE}, 71 ~{CAS}, 72 ~{RAS}, 73 BA0, 74 IOVDD, 75 IOGND, 76 BA1, 77 A10, 78 A0, 79 A1, 80 A2, 81 A3, 82 GPIO/I2CA1, 83 GLCO/GPIO/I2CA0, 84 SCLK, 85 DVDD, 86 DGND, 87 Y_9, 88 Y_8, 89 Y_7, 90 Y_6, 91 Y_5, 92 IOVDD, 93 IOGND, 94 Y_4, 95 Y_3, 96 Y_2, 97 Y_1, 98 Y_0, 99 DVDD, 100 DGND, 101 C_9/GPIO/FSO, 102 C_8/GPIO/DB, 103 C_7/GPIO/DG, 104 C_6/GPIO/DR, 105 IOVDD, 106 IOGND, 107 C_5/GPIO, 108 C_4/GPIO, 109 C_3/GPIO, 110 C_2/GPIO, 111 DVDD, 112 DGND, 113 C_1/GPIO, 114 C_0/GPIO, 115 AVID/GPIO, 116 FID/GPIO, 117 HS/CS/GPIO, 118 VS/VBLK/GPIO, 119 FSS, 120 DGND, 121 XIN, 122 XOUT, 123 PLL18VDD, 124 PLL18GND, 125 A33VDD, 126 A33GND, 127 Analog_out, 128 A33GND

## TVS SM712
designator SMF?, comment SM712
JLC: C521963; MFAC: SM712
footprint SOT-23
pins: 1, 2, 3

## TVS SMBJ28CA
designator D?, comment SMBJ28CA
JLC: C353369; MFAC: SMBJ28CA
footprint SMB (Footprint not found)
pins: A, K
text: @DesignPCB

## TVS SMF3.3.TCT
designator SMF?, comment SMF3.3.TCT
JLC: C4355034; MFAC: SMF3.3.TCT
footprint SC70-5L
pins: 1, 2, 3, 4, 5
text: @DesignPCB

## TVS TPD4E1U06DCKR
designator D?, comment TPD4E1U06DCKR
Manufacturer: TI(德州仪器); Contributor: LCSC; Supplier: LCSC; Supplier Part: C194628; Manufacturer Part: TPD4E1U06DCKR; JLCPCB Part Class: Extended Part; spicePre: D; spiceSymbolName: TPD4E1U06DCKR; JLC: C194628; MFAC: TPD4E1U06DCKR
footprint SC-70-6_L2.2-W1.3-P0.65-LS2.1-BL (Footprint not found)
pins: 1 D1+, 2 GND, 3 D2+, 4 D2-, 5 NC, 6 D1-

## TVS USBLC6-4SC6
designator U?, comment USBLC6-4SC6_C5197386
MFAC: USBLC6-4SC6; JLC: C5197386
footprint SOT-23-6L
pins: 1, 2, 3, 4, 5, 6
text: @DesignPCB

## TXC-02053
designator ?
U?
pins: 1 GND, 2 ~{TXLOC}, 3 ~{RXAIS}, 4 BERCK, 5 LQLTY, 6 GND, 7 VCOC, 8 ~{PNENB}, 9 DCK, 10 VDD, 11 GNDPLL, 12 RN, 13 RP/RD, 14 ~{CLKO}, 15 CLKO, 16 GNDPLL, 17 TXSEL, 18 VDDPLL, 19 CV, 20 ~{RXLOS}, 21 ~{RXDIS}, 22 NC, 23 VDDRX, 24 ~{LBKRX}, 25 ~{LBKTX}, 26 NC, 27 C1, 28 C2, 29 D11, 30 D12, 31 GNDRX, 32 GNDRX, 33 TNO, 34 TPO, 35 VDDTXN, 36 GNDTX, 37 VDDTXQ, 38 CLKI, 39 GND, 40 TP/TD, 41 TN, 42 VDD, 43 ~{TXAIS}, 44 CO
